# Altium footprint library General.PcbLib: 128 footprints (part 6 of 8)
Each footprint in its own frame and in the unit in brackets; x right, y up, seen from the top. Pads: shape width x height; smd on the part's side, far side on the other; paste and mask are expansions set on the pad; w line width, h text height; cw(c..) or ccw(c..) is an arc to the next point about the centre after c.
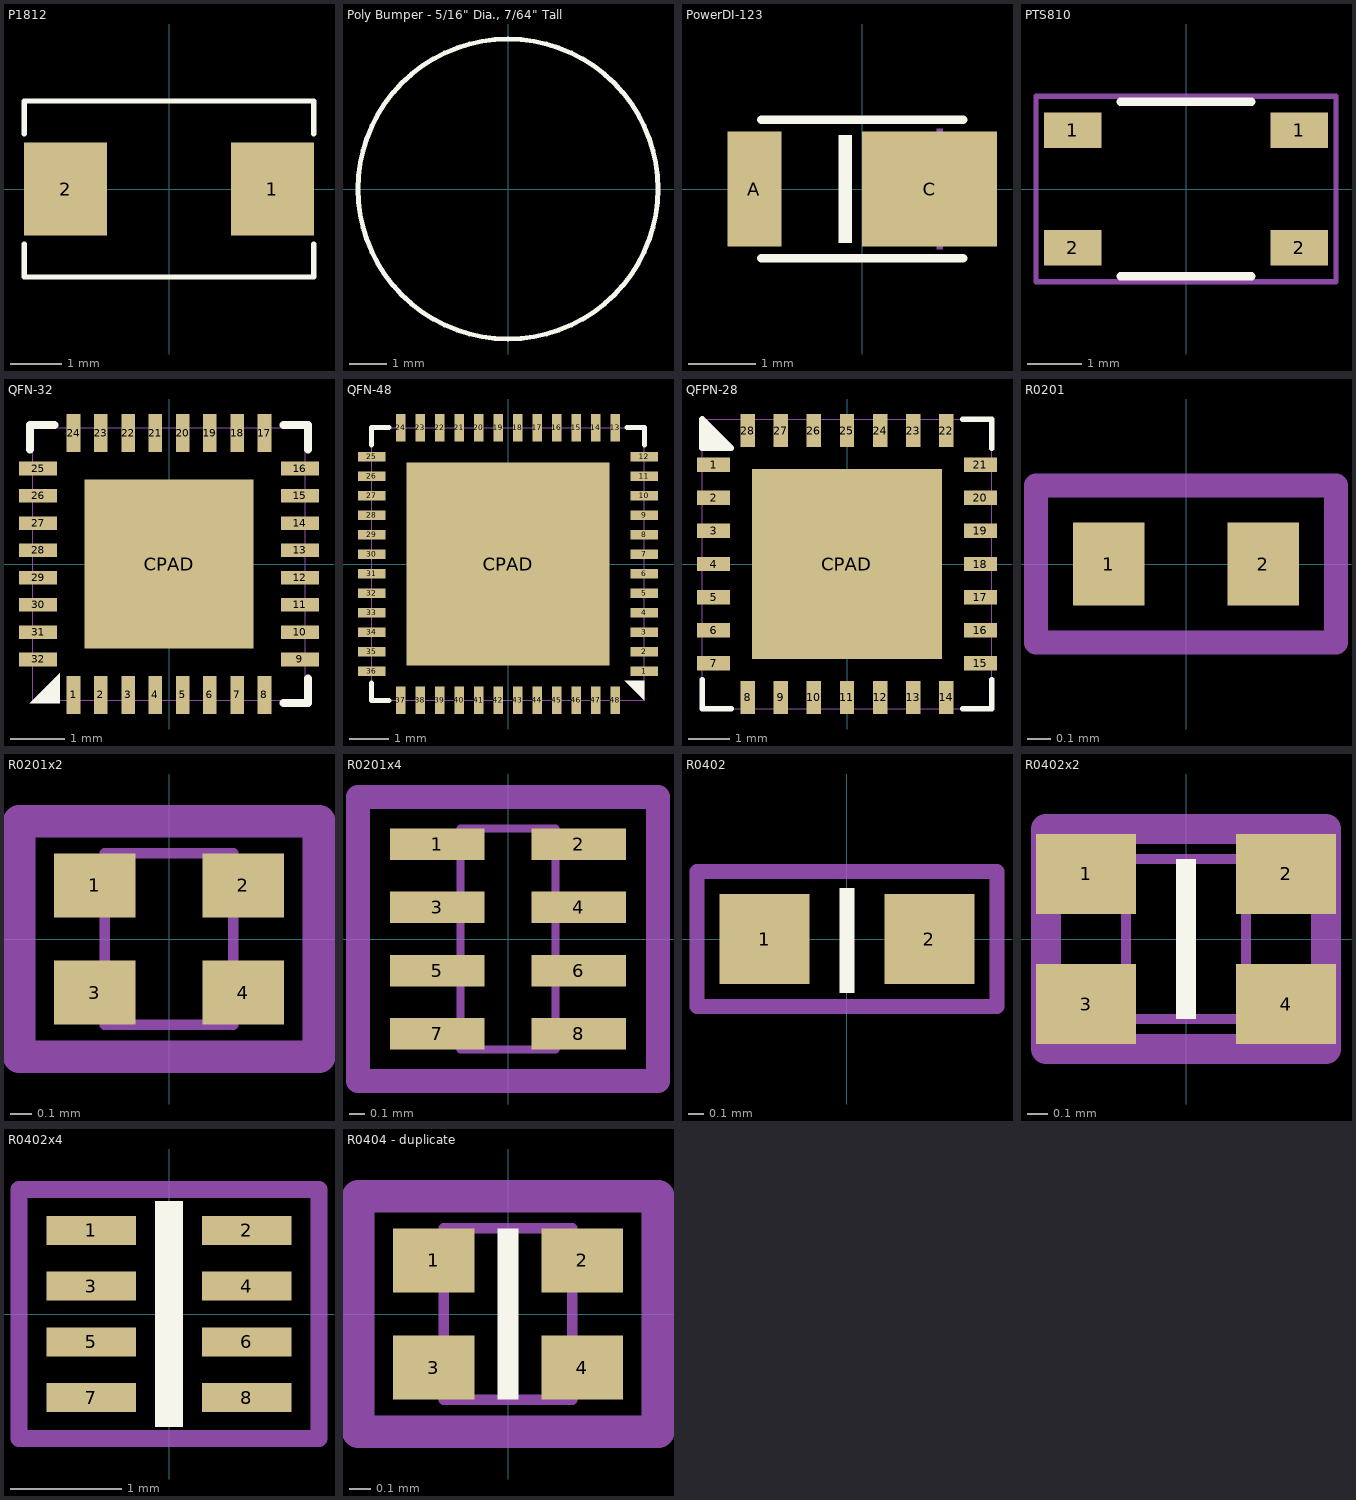
[diagram p5: the footprints below, top view; thin cyan lines are the x and y axes]

## P1812 [mm]
pads (2):
  rect 1.6x1.8 smd: 1(2,0) 2(-2,0)
Top Overlay:
  lines w0.1: -2.8,-1.067 -2.8,-1.7 2.8,-1.7 2.8,-1.067 ; -2.8,1.067 -2.8,1.7 2.8,1.7 2.8,1.067
3D body: height 3.4, standoff 0, extent -2.85,-1.75 2.85,1.75

## PCB [mm]

## PCB_PART_NUMBER [mm]
Top Overlay:
  text ".PcbPartNumber" at 0,0 h0.89

## Poly Bumper - 5/16" Dia., 7/64" Tall [mm] "Poly Bumper - 5/16\" Dia., 7/64\" Tall"
height 2.769
Top Overlay:
  circle w0.127: c0,0 r3.969
3D body: height 2.77, standoff 0, extent -3.968,-3.968 3.968,3.968

## PowerDI-123 [mm]
pads (2):
  rect 0.8x1.7 smd: A(-1.6,0)
  rect 2x1.7 smd: C(1,0)
Top Overlay:
  rectangle: -0.35,-0.8 -0.15,0.8
  lines w0.127: -1.5,-1.025 1.5,-1.025 ; -1.5,1.025 1.5,1.025
Mechanical 1:
  rectangle: 1.1,-0.9 1.2,0.9
3D body: height 1, standoff 0, extent -1.563,-1.063 1.563,1.063
3D body: height 1.01, standoff 0, extent 1.1,-0.9 1.2,0.9

## PTS810 [mm] "SWITCH TACTILE SPST-NO 0.05A 32V"
height 2.5
pads (4):
  rect 1.05x0.65 smd: 1(-2.075,1.075) 1(2.075,1.075) 2(-2.075,-1.075) 2(2.075,-1.075)
Top Overlay:
  lines w0.15: -1.2,-1.6 1.2,-1.6 ; -1.2,1.6 1.2,1.6
Mechanical 15:
  lines w0.1: -2.75,-1.7 2.75,-1.7 2.75,1.7 -2.75,1.7 -2.75,-1.7
3D body "PTS810SJK250SMTRLFS.stp": height 2.5, standoff 0, extent -2.287,-1.6 2.288,1.6

## QFN-32 [mm]
pads (33):
  rect 0.25x0.7 smd: 1(-1.75,-2.4) 2(-1.25,-2.4) 3(-0.75,-2.4) 4(-0.25,-2.4) 5(0.25,-2.4) 6(0.75,-2.4) 7(1.25,-2.4) 8(1.75,-2.4) 17(1.75,2.4) 18(1.25,2.4) 19(0.75,2.4) 20(0.25,2.4) 21(-0.25,2.4) 22(-0.75,2.4) 23(-1.25,2.4) 24(-1.75,2.4)
  rect 0.7x0.25 smd: 9(2.4,-1.75) 10(2.4,-1.25) 11(2.4,-0.75) 12(2.4,-0.25) 13(2.4,0.25) 14(2.4,0.75) 15(2.4,1.25) 16(2.4,1.75) 25(-2.4,1.75) 26(-2.4,1.25) 27(-2.4,0.75) 28(-2.4,0.25) 29(-2.4,-0.25) 30(-2.4,-0.75) 31(-2.4,-1.25) 32(-2.4,-1.75)
  rect 3.1x3.1 smd paste-0.7: CPAD(0,0)
Top Overlay:
  region: -2.55,-2.55 -2,-2 -2,-2.55
  lines w0.15: -2.55,2.1 -2.55,2.55 -2.1,2.55 ; 2.1,-2.55 2.55,-2.55 2.55,-2.1 ; 2.1,2.55 2.55,2.55 2.55,2.1
Mechanical 1:
  lines w0: -2.5,-2.5 2.5,-2.5 2.5,2.5 -2.5,2.5 -2.5,-2.5
3D body: height 1, standoff 0, extent -2.499,-2.499 2.499,2.499

## QFN-48 [mm]
pads (49):
  rect 0.7x0.25 smd: 1(3.5,-2.75) 2(3.5,-2.25) 3(3.5,-1.75) 4(3.5,-1.25) 5(3.5,-0.75) 6(3.5,-0.25) 7(3.5,0.25) 8(3.5,0.75) 9(3.5,1.25) 10(3.5,1.75) 11(3.5,2.25) 12(3.5,2.75) 25(-3.5,2.75) 26(-3.5,2.25) 27(-3.5,1.75) 28(-3.5,1.25) 29(-3.5,0.75) 30(-3.5,0.25) 31(-3.5,-0.25) 32(-3.5,-0.75) 33(-3.5,-1.25) 34(-3.5,-1.75) 35(-3.5,-2.25) 36(-3.5,-2.75)
  rect 0.25x0.7 smd: 13(2.75,3.5) 14(2.25,3.5) 15(1.75,3.5) 16(1.25,3.5) 17(0.75,3.5) 18(0.25,3.5) 19(-0.25,3.5) 20(-0.75,3.5) 21(-1.25,3.5) 22(-1.75,3.5) 23(-2.25,3.5) 24(-2.75,3.5) 37(-2.75,-3.5) 38(-2.25,-3.5) 39(-1.75,-3.5) 40(-1.25,-3.5) 41(-0.75,-3.5) 42(-0.25,-3.5) 43(0.25,-3.5) 44(0.75,-3.5) 45(1.25,-3.5) 46(1.75,-3.5) 47(2.25,-3.5) 48(2.75,-3.5)
  rect 5.2x5.2 smd paste-1: CPAD(0,0)
Top Overlay:
  region: 3.5,-3.5 3,-3 3.5,-3
  lines w0.127: -3.5,-3.05 -3.5,-3.5 -3.05,-3.5 ; -3.5,3.05 -3.5,3.5 -3.05,3.5 ; 3.05,3.5 3.5,3.5 3.5,3.05
Mechanical 1:
  lines w0: -3.5,-3.5 -3.5,3.5 3.5,3.5 3.5,-3.5 -3.5,-3.5
3D body: height 0.9, standoff 0, extent -3.499,-3.499 3.499,3.499

## QFPN-28 [mm]
pads (29):
  rect 0.8x0.35 smd: 1(-3.225,2.4) 2(-3.225,1.6) 3(-3.225,0.8) 4(-3.225,0) 5(-3.225,-0.8) 6(-3.225,-1.6) 7(-3.225,-2.4) 15(3.225,-2.4) 16(3.225,-1.6) 17(3.225,-0.8) 18(3.225,0) 19(3.225,0.8) 20(3.225,1.6) 21(3.225,2.4)
  rect 0.35x0.8 smd: 8(-2.4,-3.225) 9(-1.6,-3.225) 10(-0.8,-3.225) 11(0,-3.225) 12(0.8,-3.225) 13(1.6,-3.225) 14(2.4,-3.225) 22(2.4,3.225) 23(1.6,3.225) 24(0.8,3.225) 25(0,3.225) 26(-0.8,3.225) 27(-1.6,3.225) 28(-2.4,3.225)
  rect 4.6x4.6 smd paste-0.9: CPAD(0,0)
Top Overlay:
  region: -3.5,3.5 -2.8,2.8 -3.5,2.8
  lines w0.127: -3.5,-2.8 -3.5,-3.5 -2.8,-3.5 ; -3.5,3.5 -3.5,2.8 -2.8,2.8 ; 2.8,-3.5 3.5,-3.5 3.5,-2.8 ; 2.8,3.5 3.5,3.5 3.5,2.8
  lines w0.15: -3.5,2.8 -3.5,3.5 -2.8,2.8 -3.5,2.8
Mechanical 1:
  lines w0: -3.5,-3.5 3.5,-3.5 3.5,3.5 -3.5,3.5 -3.5,-3.5
3D body: height 1.8, standoff 0, extent -3.499,-3.499 3.499,3.499

## R0201 [mm]
pads (2):
  rect 0.3x0.351 smd: 1(-0.325,0) 2(0.325,0)
Mechanical 15:
  lines w0.1: -0.63,-0.33 -0.63,0.33 0.63,0.33 0.63,-0.33 -0.63,-0.33
3D body "User Library-res0201-1.STEP": height 0.23, standoff 0, extent -0.3,-0.15 0.3,0.15

## R0201x2 [mm]
height 0.35
pads (4):
  rect 0.381x0.3 smd: 1(-0.346,0.25) 2(0.346,0.25) 3(-0.346,-0.25) 4(0.346,-0.25)
Mechanical 2:
  lines w0.05: -0.3,-0.4 -0.3,0.4 0.3,0.4 0.3,-0.4 -0.3,-0.4
Mechanical 15:
  lines w0.152: -0.7,-0.55 -0.7,0.55 0.7,0.55 0.7,-0.55 -0.7,-0.55
3D body: height 0.35, standoff 0, extent -0.299,-0.399 0.299,0.399

## R0201x4 [mm]
height 0.35
pads (8):
  rect 0.6x0.2 smd: 1(-0.448,0.6) 2(0.448,0.6) 3(-0.448,0.2) 4(0.448,0.2) 5(-0.448,-0.2) 6(0.448,-0.2) 7(-0.448,-0.6) 8(0.448,-0.6)
Mechanical 2:
  lines w0.05: -0.3,-0.7 -0.3,0.7 0.3,0.7 0.3,-0.7 -0.3,-0.7
Mechanical 15:
  lines w0.152: -0.95,-0.9 -0.95,0.9 0.95,0.9 0.95,-0.9 -0.95,-0.9
3D body: height 0.35, standoff 0, extent -0.299,-0.699 0.299,0.699

## R0402 [mm]
pads (2):
  rect 0.6x0.6 smd: 1(-0.55,0) 2(0.55,0)
Top Overlay:
  rectangle: -0.05,-0.36 0.05,0.34
Mechanical 15:
  lines w0.1: -1,-0.45 1,-0.45 1,0.45 -1,0.45 -1,-0.45
3D body "SW3dPS-0402 SMD Resistor.step": height 0.2, standoff 0, extent -0.5,-0.3 0.5,0.3

## R0402x2 [mm]
height 0.4
pads (4):
  rect 0.5x0.4 smd: 1(-0.5,0.325) 2(0.5,0.325) 3(-0.5,-0.325) 4(0.5,-0.325)
Top Overlay:
  rectangle: -0.05,-0.4 0.05,0.4
Mechanical 2:
  lines w0.05: -0.3,-0.4 0.3,-0.4 0.3,0.4 -0.3,0.4 -0.3,-0.4
Mechanical 15:
  lines w0.152: -0.7,-0.55 0.7,-0.55 0.7,0.55 -0.7,0.55 -0.7,-0.55
3D body "User Library-YC122.STEP": height 0.35, standoff 0, extent -0.5,-0.5 0.5,0.5

## R0402x4 [mm]
pads (8):
  rect 0.8x0.26 smd: 1(-0.698,0.75) 2(0.698,0.75) 3(-0.698,0.25) 4(0.698,0.25) 5(-0.698,-0.25) 6(0.698,-0.25) 7(-0.698,-0.75) 8(0.698,-0.75)
Top Overlay:
  rectangle: -0.127,-1.016 0.127,1.016
Mechanical 15:
  lines w0.152: -1.346,-1.118 -1.346,1.118 1.346,1.118 1.346,-1.118 -1.346,-1.118
3D body "SW3dPS-YC124.STEP": height 0.38, standoff 0.02, extent -0.495,-1 0.505,1

## R0404 - duplicate [mm]
height 0.4
pads (4):
  rect 0.381x0.3 smd: 1(-0.346,0.25) 2(0.346,0.25) 3(-0.346,-0.25) 4(0.346,-0.25)
Top Overlay:
  rectangle: -0.05,-0.4 0.05,0.4
Mechanical 2:
  lines w0.05: -0.3,-0.4 0.3,-0.4 0.3,0.4 -0.3,0.4 -0.3,-0.4
Mechanical 15:
  lines w0.152: -0.7,-0.55 0.7,-0.55 0.7,0.55 -0.7,0.55 -0.7,-0.55
3D body: height 0.35, standoff 0, extent -0.299,-0.399 0.299,0.399